# Altium footprint library SMD_Bauteile.PcbLib: 355 footprints (part 23 of 23)
Each footprint in its own frame and in the unit in brackets; x right, y up, seen from the top. Pads: shape width x height; smd on the part's side, far side on the other; paste and mask are expansions set on the pad; w line width, h text height; cw(c..) or ccw(c..) is an arc to the next point about the centre after c.
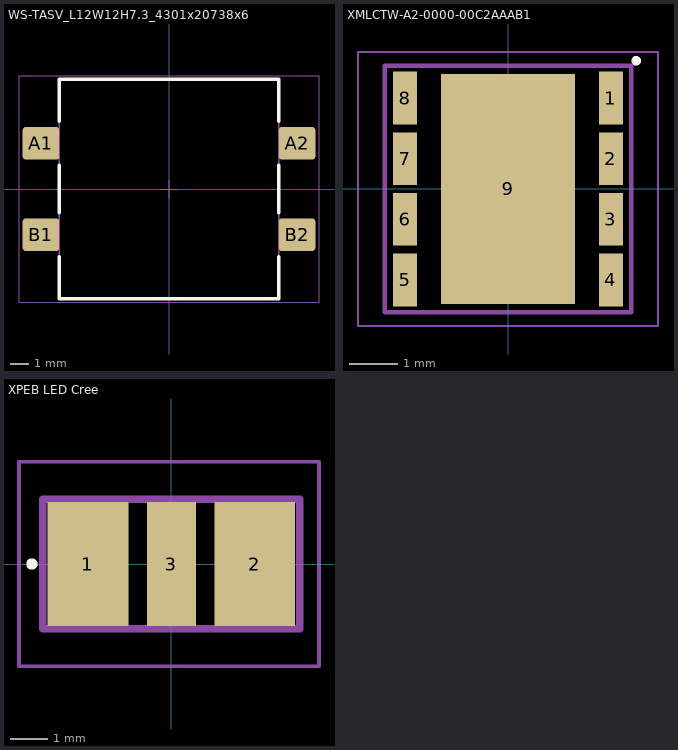
[diagram p22: the footprints below, top view; thin cyan lines are the x and y axes]

## WS-TASV_L12W12H7.3_4301x20738x6 [mm] "Tact Switch, SMD, body 12x12mm"
height 7.3
pads (4):
  rrect20% 2x1.8 smd: A1(-7,2.5) A2(7,2.5) B1(-7,-2.5) B2(7,-2.5)
Top Overlay:
  lines w0.2: -6,-3.7 -6,-6 6,-6 6,-3.7 ; -6,-1.3 -6,1.3 ; -6,3.7 -6,6 6,6 6,3.7 ; 6,-1.3 6,1.3
Top Component Center:
  lines w0.05: -0.5,0 0.5,0 ; 0,-0.5 0,0.5
Top Component Outline:
  lines w0.1: -6,-3 -7.65,-3 -7.65,-2 -6,-2 ; -6,2 -7.65,2 -7.65,3 -6,3 ; 6,-3 7.65,-3 7.65,-2 6,-2 ; 6,2 7.65,2 7.65,3 6,3 ; -6,-6 -6,6 6,6 6,-6 -6,-6
Top Courtyard (Mech26):
  lines w0.05: -8.2,-6.2 8.2,-6.2 8.2,6.2 -8.2,6.2 -8.2,-6.2
Top Designator:
  text ".Designator" at -4.998,-0.333 h1
3D body "4301x20738x6.stp": height 7.3, standoff 0, extent -7.65,-6 7.65,6

## XMLCTW-A2-0000-00C2AAAB1 [mm] "LED Red 630 / Green 535 / Blue 465 / White 4300K"
height 3.02
pads (9):
  rect 0.5x1.1 smd: 1(2.14,1.89) 2(2.14,0.63) 3(2.14,-0.63) 4(2.14,-1.89) 5(-2.14,-1.89) 6(-2.14,-0.63) 7(-2.14,0.63) 8(-2.14,1.89)
  rect 2.78x4.78 smd paste-1.39: 9(0,0)
Top Overlay:
  circle w0.1: c2.667,2.667 r0.05
Top Paste:
  rectangle: -1.29,1.3 -0.1,2.3
  rectangle: -1.29,0.1 -0.1,1.1
  rectangle: -1.29,-1.1 -0.1,-0.1
  rectangle: -1.29,-2.3 -0.1,-1.3
  rectangle: 0.1,1.3 1.29,2.3
  rectangle: 0.1,0.1 1.29,1.1
  rectangle: 0.1,-1.1 1.29,-0.1
  rectangle: 0.1,-2.3 1.29,-1.3
Mech Misc 1:
  lines w0.1: -2.565,-2.565 -2.565,2.565 2.565,2.565 2.565,-2.565 -2.565,-2.565
Mech 15:
  lines w0.05: -3.12,-2.85 -3.12,2.85 3.12,2.85 3.12,-2.85 -3.12,-2.85
  lines w0.1: -0.5,0 0.5,0 ; 0,-0.5 0,0.5
3D body: height 3.02, standoff 0.1, extent -2.565,-2.565 2.565,2.565

## XPEB LED Cree [mm] "enlarged pads for soldering"
pads (3):
  rect 2.151x3.3 smd: 1(-2.225,0) 2(2.225,0)
  rect 1.3x3.3 smd: 3(0,0)
Top Overlay:
  lines w0.2: -3.77,0 ccw(c-3.72,0) -3.67,0 ; -3.77,0 cw(c-3.72,0) -3.67,0 ; -3.77,0 ccw(c-3.72,0) -3.67,0
Mech Misc 1:
  lines w0.2: -3.429,-1.725 3.429,-1.725 3.429,1.725 -3.429,1.725 -3.429,-1.725
Mech 15:
  lines w0.1: -4.064,-2.725 3.937,-2.725 3.937,2.725 -4.064,2.725 -4.064,-2.725
3D body "XPEBGR-L1-0000-00E01.stp": height 2.49, standoff 0, extent -1.725,-1.725 1.725,1.725